# Altium footprint library PcbLib1.PcbLib: 157 footprints (part 10 of 10)
Each footprint in its own frame and in the unit in brackets; x right, y up, seen from the top. Pads: shape width x height; smd on the part's side, far side on the other; paste and mask are expansions set on the pad; w line width, h text height; cw(c..) or ccw(c..) is an arc to the next point about the centre after c.
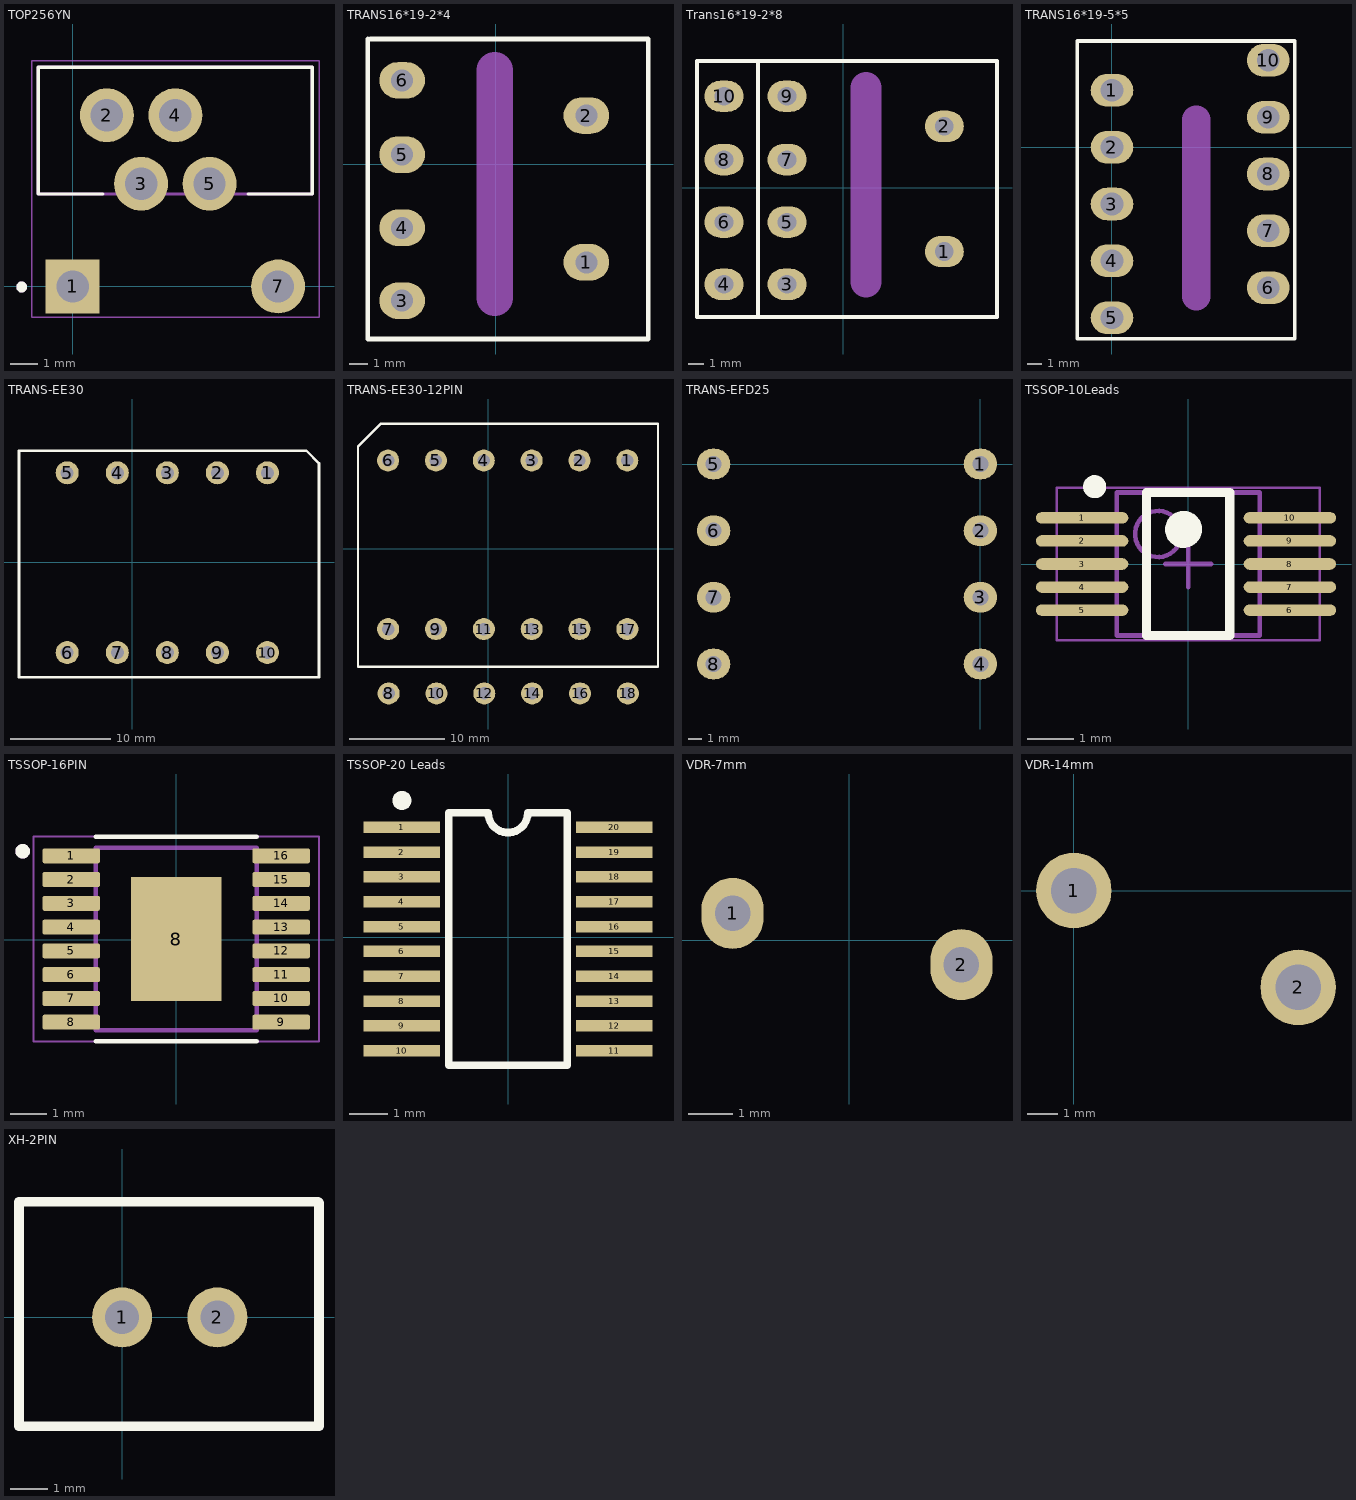
[diagram p9: the footprints below, top view; thin cyan lines are the x and y axes]

## TOP256YN [mm]
pads (6):
  rect 2x2 hole 1.2: 1(0,0)
  round 2 hole 1.2: 2(1.27,6.35) 3(2.54,3.81) 4(3.81,6.35) 5(5.08,3.81) 7(7.62,0)
Top Overlay:
  circle w0.2: c-1.89,-0.02 r0.1
  lines w0.127: 1.11,3.43 -1.27,3.43 -1.27,8.13 8.89,8.13 8.89,3.43 6.51,3.43
Mechanical 13:
  circle w0.2: c-1.89,-0.02 r0.1
  lines w0.127: -1.27,3.43 -1.27,8.13 8.89,8.13 8.89,3.43 -1.27,3.43
Mechanical 15:
  lines w0.05: -1.52,-1.15 -1.52,8.38 9.14,8.38 9.14,-1.15 -1.52,-1.15
3D body "User Library-TO-220-7C.STEP": height 19.94, standoff -1.5, extent -1.4,-0.205 9,7.925

## TRANS16*19-2*4 [mm]
pads (6):
  oval 2.5x2 hole 1.2: 1(4.969,-5.364) 2(4.969,2.667) 3(-5.111,-7.462) 4(-5.111,-3.477) 5(-5.111,0.529) 6(-5.111,4.593)
Top Overlay:
  lines w0.254: -6.985,6.858 -6.985,-9.56 8.347,-9.56 8.347,6.858 -6.858,6.858
Mechanical 1:
  lines w2: -0.047,-7.309 -0.047,5.137
3D body "Triad Magnetics-TY-303P.STEP": height 16.51, standoff -6.1, extent -9,-11.812 9.542,8.812

## Trans16*19-2*8 [mm]
pads (10):
  oval 2.5x2 hole 1.2: 1(6.493,-4.094) 2(6.493,3.937) 3(-3.587,-6.192) 4(-7.63,-6.192) 5(-3.587,-2.207) 6(-7.63,-2.207) 7(-3.587,1.799) 8(-7.63,1.799) 9(-3.587,5.863) 10(-7.63,5.863)
Top Overlay:
  lines w0.254: -5.461,-8.29 -5.461,8.128 ; -9.363,-8.29 -9.363,8.128 9.871,8.128 9.871,-8.29 -9.363,-8.29
Mechanical 1:
  lines w2: 1.477,-6.039 1.477,6.407
3D body "Triad Magnetics-TY-303P.STEP": height 16.51, standoff -6.1, extent -8.771,-10 9.771,10.625

## TRANS16*19-5*5 [mm]
pads (10):
  oval 3x2.3 hole 1.6: 1(0,4) 2(0,0) 3(0,-4) 4(0,-8) 5(0,-12) 6(11,-9.887) 7(11,-5.887) 8(11,-1.887) 9(11,2.113) 10(11,6.113)
Top Overlay:
  lines w0.254: -2.458,-13.475 12.874,-13.475 12.874,7.475 -2.458,7.475 -2.458,-13.475
Mechanical 1:
  lines w2: 5.936,-10.501 5.936,1.945
3D body "Triad Magnetics-TY-303P.STEP": height 16.51, standoff -6.1, extent -3.653,-14.176 14.889,6.448

## TRANS-EE30 [mm]
pads (10):
  round 2.3 hole 1.3: 1(13.519,8.966) 2(8.519,8.966) 3(3.519,8.966) 4(-1.481,8.966) 5(-6.481,8.966) 6(-6.481,-9) 7(-1.481,-9) 8(3.519,-9) 9(8.519,-9) 10(13.519,-9)
Top Overlay:
  lines w0.254: -11.3,-11.475 18.675,-11.475 18.675,9.9 17.4,11.175 -11.275,11.175 -11.3,11.15 -11.3,-11.475
3D body "User Library-Trafo EE30.STEP": height 26.65, standoff -3.5, extent -11.4,-11.325 18.6,11.175

## TRANS-EE30-12PIN [mm]
pads (18):
  round 2.3 hole 1.3: 1(14.544,9.216) 2(9.544,9.216) 3(4.544,9.216) 4(-0.456,9.216) 5(-5.456,9.216) 6(-10.456,9.216) 7(-10.45,-8.4) 8(-10.4,-15.125) 9(-5.45,-8.4) 10(-5.4,-15.125) 11(-0.45,-8.4) 12(-0.4,-15.125) 13(4.55,-8.4) 14(4.6,-15.125) 15(9.55,-8.4) 16(9.6,-15.125) 17(14.55,-8.4) 18(14.6,-15.125)
Top Overlay:
  lines w0.254: -13.6,-12.35 -13.6,10.675 -11.2,13.075 17.75,13.075 17.75,-12.35 -13.6,-12.35
3D body "User Library-TR_EER30.STEP": height 32.6, standoff -3, extent -13.625,-12.4 17.775,13.1

## TRANS-EFD25 [mm]
pads (8):
  oval 2.5x2.3 hole 1.2: 1(0,0) 2(0,-5) 3(0,-10) 4(0,-15) 5(-20,0) 6(-20,-5) 7(-20,-10) 8(-20,-15)
3D body "User Library-EFD25(5+5).STEP": height 15.75, standoff -4, extent -23.025,-20.3 3.075,5.4

## TSSOP-10Leads [mm] "TSSOP, 10-Leads, Body 3x3mm, Pitch 0.5mm, IPC High Density"
height 1.1
pads (10):
  oval 2x0.25 smd: 1(-2.296,1) 2(-2.296,0.5) 3(-2.296,0) 4(-2.296,-0.5) 5(-2.296,-1) 6(2.204,-1) 7(2.204,-0.5) 8(2.204,0) 9(2.204,0.5) 10(2.204,1)
Top Overlay:
  circle w0.25: c-2.025,1.675 r0.125
  circle w0.4: c-0.1,0.75 r0.2
  lines w0.2: -0.9,-1.55 -0.9,1.55 0.9,1.55 0.9,-1.55 -0.9,-1.55
Mechanical 13:
  circle w0.1: c-0.65,0.65 r0.5
  lines w0.1: -1.55,-1.55 -1.55,1.55 1.55,1.55 1.55,-1.55 -1.55,-1.55
Mechanical 15:
  lines w0.05: -2.85,-1.65 -2.85,1.65 2.85,1.65 2.85,-1.65 -2.85,-1.65
  lines w0.1: -0.5,0 0.5,0 ; 0,-0.5 0,0.5
3D body "User Library-TSSOP-10.STEP": height 1.1, standoff 0, extent -2.575,-1.5 2.425,1.5

## TSSOP-16PIN [mm]
pads (17):
  rrect25% 1.57x0.41 smd: 1(-2.87,2.3) 2(-2.87,1.65) 3(-2.87,1) 4(-2.87,0.35) 5(-2.87,-0.3) 6(-2.87,-0.95) 7(-2.87,-1.6) 8(-2.87,-2.25) 9(2.87,-2.25) 10(2.87,-1.6) 11(2.87,-0.95) 12(2.87,-0.3) 13(2.87,0.35) 14(2.87,1) 15(2.87,1.65) 16(2.87,2.3)
  rect 2.48x3.4 smd paste-3: 8(0,0.025)
Top Overlay:
  circle w0.2: c-4.2,2.425 r0.1
  lines w0.127: -2.2,-2.775 2.2,-2.775 ; -2.2,2.825 2.2,2.825
Top Paste:
  region: 0.8,-1.05 -0.8,-1.05 -0.8,1.1 0.8,1.1
Mechanical 13:
  circle w0.2: c-4.2,2.425 r0.1
  lines w0.127: -2.2,-2.475 -2.2,2.525 2.2,2.525 2.2,-2.475 -2.2,-2.475
Mechanical 15:
  lines w0.05: -3.905,-2.775 -3.905,2.825 3.905,2.825 3.905,-2.775 -3.905,-2.775
3D body "User Library-TSSOP-16-2.STEP": height 1.2, standoff 0, extent -3.2,-2.475 3.2,2.525

## TSSOP-20 Leads [mm] "Shrink Small Outline; 20 Leads; Body Width 4.4 mm; Pitch 0.65 mm"
height 1.2
pads (20):
  rect 2x0.3 smd: 1(-2.775,2.875) 2(-2.775,2.225) 3(-2.775,1.575) 4(-2.775,0.925) 5(-2.775,0.275) 6(-2.775,-0.375) 7(-2.775,-1.025) 8(-2.775,-1.675) 9(-2.775,-2.325) 10(-2.775,-2.975) 11(2.775,-2.975) 12(2.775,-2.325) 13(2.775,-1.675) 14(2.775,-1.025) 15(2.775,-0.375) 16(2.775,0.275) 17(2.775,0.925) 18(2.775,1.575) 19(2.775,2.225) 20(2.775,2.875)
Top Overlay:
  circle w0.25: c-2.775,3.575 r0.125
  lines w0.2: -1.55,-3.35 1.55,-3.35 1.55,3.25 0.517,3.25 cw(c0,3.25) -0.517,3.25 -1.55,3.25 -1.55,-3.35
3D body "User Library-tssop-20-1.STEP": height 1.2, standoff 0, extent -3.25,-3.35 3.35,3.25

## VDR-7mm [mm]
pads (2):
  oval 1.4x1.6 hole 0.8: 1(-2.625,0.6) 2(2.525,-0.55)
3D body "User Library-07D431K.STEP": height 10, standoff -3, extent -4.05,-1.675 3.95,1.725

## VDR-14mm [mm]
pads (2):
  round 2.5 hole 1.5: 1(0,0) 2(7.425,-3.2)
3D body "User Library-VARISTOR 387V 6KA DISC 14MM.STEP": height 23, standoff -20, extent -4.275,-4.375 11.725,1.125

## XH-2PIN [mm]
pads (2):
  round 1.6 hole 0.9: 1(0,0) 2(2.54,0)
Top Overlay:
  lines w0.254: -2.75,-2.9 5.25,-2.9 5.25,3.05 5.225,3.075 -2.75,3.075 -2.75,-2.9
3D body "User Library-XH2_54_2PIN.STEP": height 7, standoff -4, extent -2.75,-2.925 5.25,3.075